# Altium footprint library SparkFun.PCBLIB: 674 footprints (part 42 of 44)
Each footprint in its own frame and in the unit in brackets; x right, y up, seen from the top. Pads: shape width x height; smd on the part's side, far side on the other; paste and mask are expansions set on the pad; w line width, h text height; cw(c..) or ccw(c..) is an arc to the next point about the centre after c.
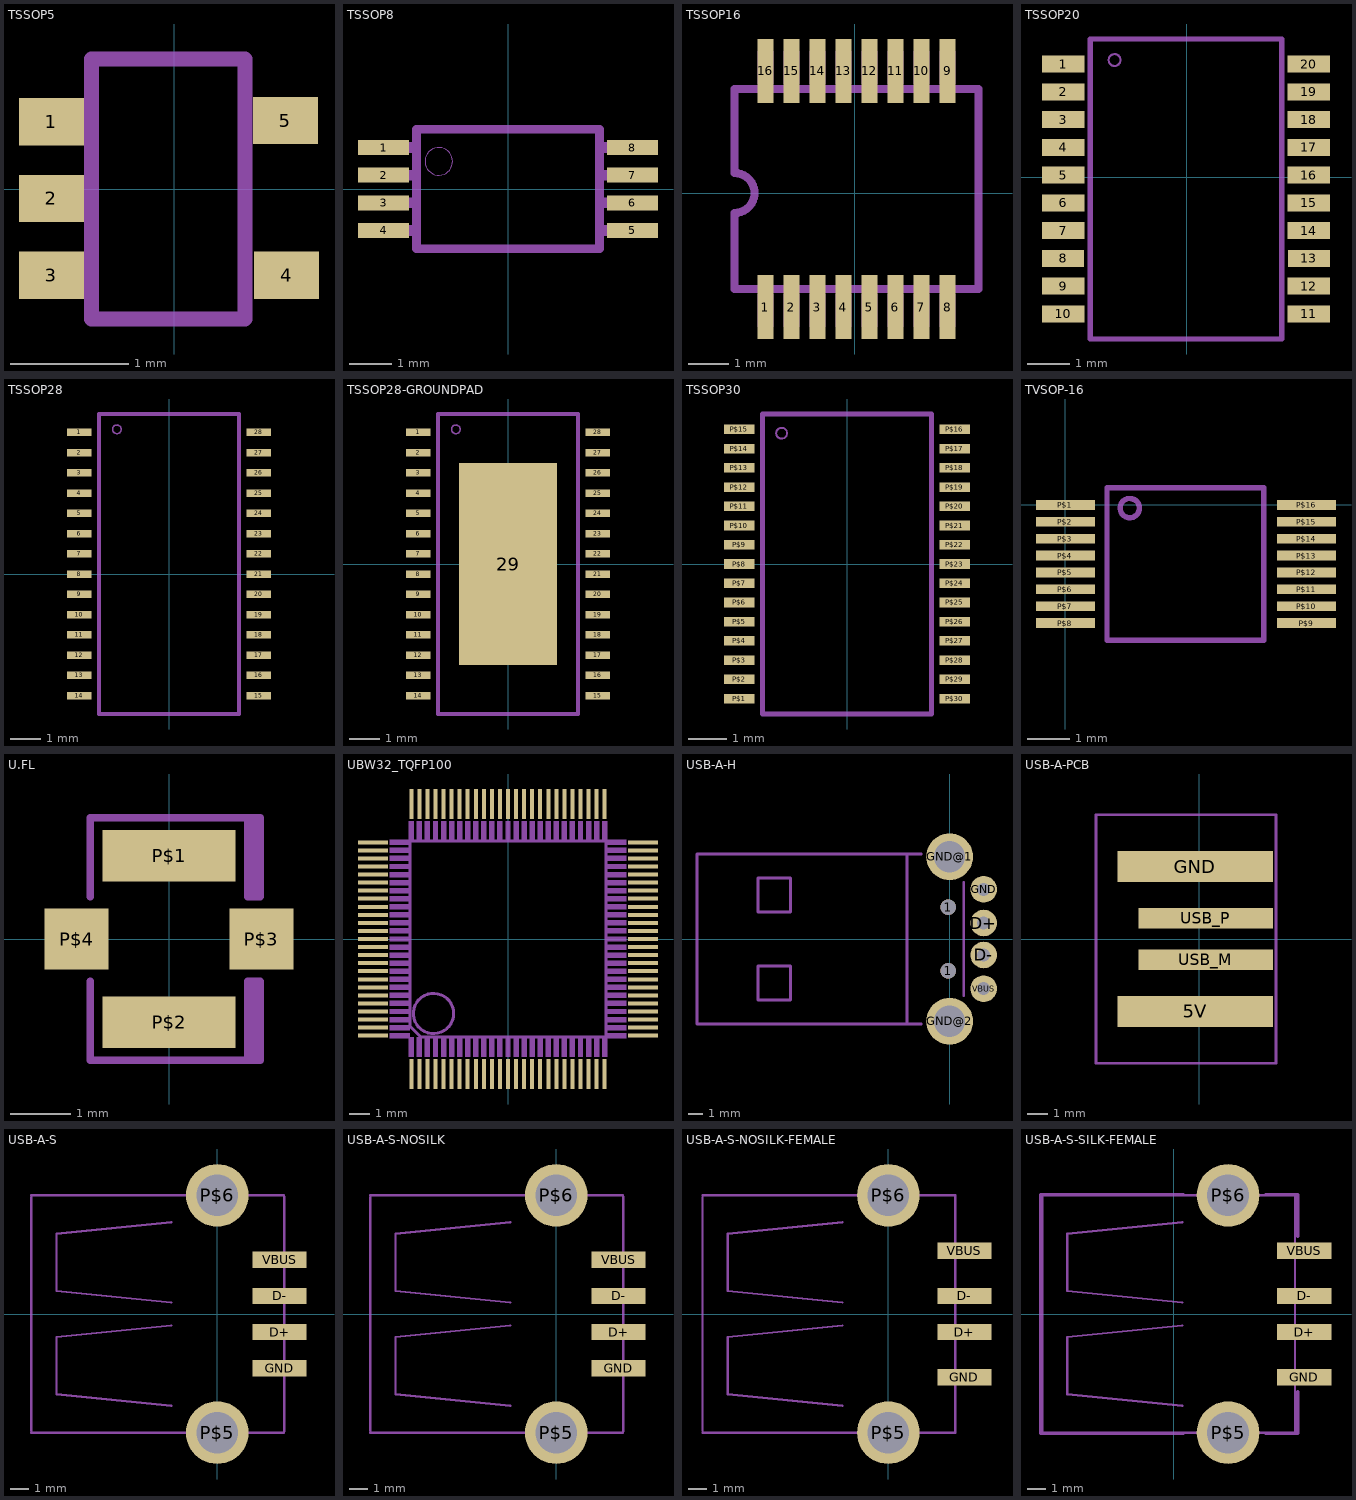
[diagram p41: the footprints below, top view; thin cyan lines are the x and y axes]

## TSSOP5 [mm]
pads (5):
  rect 0.55x0.4 smd: 1(-1.04,0.57) 2(-1.04,-0.08) 3(-1.04,-0.73) 4(0.95,-0.73) 5(0.94,0.58)
Mechanical 2:
  lines w0.127: -0.7,-1 -0.7,-1.1 0.6,-1.1 0.6,-1.02 ; -0.7,0.89 -0.7,1.1 0.59,1.1 0.6,1.1 0.6,0.89
Mechanical 18:
  lines w0.127: -0.7,-1.1 0.6,-1.1 0.6,1.1 -0.7,1.1 -0.7,-1.1

## TSSOP8 [mm]
pads (8):
  rect 1.2x0.35 smd: 1(-2.925,0.975) 2(-2.925,0.325) 3(-2.925,-0.325) 4(-2.925,-0.975) 5(2.925,-0.975) 6(2.925,-0.325) 7(2.925,0.325) 8(2.925,0.975)
Mechanical 2:
  circle w0: c-1.625,0.65 r0.325
  lines w0.203: -2.15,-1.4 2.15,-1.4 2.15,1.4 -2.15,1.4 -2.15,-1.4
Mechanical 18:
  rectangle: -3.2,0.85 -2.2,1.1
  rectangle: -3.2,0.2 -2.2,0.45
  rectangle: -3.2,-0.45 -2.2,-0.2
  rectangle: -3.2,-1.1 -2.2,-0.85
  rectangle: 2.2,-1.1 3.2,-0.85
  rectangle: 2.2,-0.45 3.2,-0.2
  rectangle: 2.2,0.2 3.2,0.45
  rectangle: 2.2,0.85 3.2,1.1

## TSSOP16 [mil]
pads (16):
  rect 15.75x62.99 smd: 1(-87.6,-112.2) 2(-62.01,-112.2) 3(-36.42,-112.2) 4(-10.83,-112.2) 5(14.76,-112.2) 6(40.35,-112.2) 7(65.94,-112.2) 8(91.54,-112.2) 9(91.54,120.08) 10(65.94,120.08) 11(40.35,120.08) 12(14.76,120.08) 13(-10.83,120.08) 14(-36.42,120.08) 15(-62.01,120.08) 16(-87.6,120.08)
Mechanical 2:
  lines w8: -110.24,-94.49 -118.11,-94.49 -118.11,-19.69 ccw(c-118.11,0) -118.11,19.69 -118.11,102.36 -110.24,102.36 ; 114.17,-94.49 122.05,-94.49 122.05,102.36 114.17,102.36
Mechanical 18:
  rectangle: -95.47,-131.89 -79.72,-99.6
  rectangle: -69.88,-131.89 -54.13,-99.6
  rectangle: -44.29,-131.89 -28.54,-99.6
  rectangle: -18.7,-131.89 -2.95,-99.6
  rectangle: 6.89,-131.89 22.64,-99.6
  rectangle: 32.48,-131.89 48.23,-99.6
  rectangle: 58.07,-131.89 73.82,-99.6
  rectangle: 83.66,-131.89 99.41,-99.6
  rectangle: 83.66,107.48 99.41,139.77
  rectangle: 58.07,107.48 73.82,139.77
  rectangle: 32.48,107.48 48.23,139.77
  rectangle: 6.89,107.48 22.64,139.77
  rectangle: -18.7,107.48 -2.95,139.77
  rectangle: -44.29,107.48 -28.54,139.77
  rectangle: -69.88,107.48 -54.13,139.77
  rectangle: -95.47,107.48 -79.72,139.77
  rectangle: -95.47,-131.89 -79.72,-99.6
  rectangle: -69.88,-131.89 -54.13,-99.6
  rectangle: -44.29,-131.89 -28.54,-99.6
  rectangle: -18.7,-131.89 -2.95,-99.6
  rectangle: 6.89,-131.89 22.64,-99.6
  rectangle: 32.48,-131.89 48.23,-99.6
  rectangle: 58.07,-131.89 73.82,-99.6
  rectangle: 83.66,-131.89 99.41,-99.6
  rectangle: 83.66,107.48 99.41,139.77
  rectangle: 58.07,107.48 73.82,139.77
  rectangle: 32.48,107.48 48.23,139.77
  rectangle: 6.89,107.48 22.64,139.77
  rectangle: -18.7,107.48 -2.95,139.77
  rectangle: -44.29,107.48 -28.54,139.77
  rectangle: -69.88,107.48 -54.13,139.77
  rectangle: -95.47,107.48 -79.72,139.77
  lines w8: -118.11,-94.49 122.05,-94.49 122.05,102.36 -118.11,102.36

## TSSOP20 [mm]
pads (20):
  rect 1x0.4 smd: 1(-2.937,2.693) 2(-2.937,2.033) 3(-2.937,1.372) 4(-2.937,0.712) 5(-2.937,0.051) 6(-2.937,-0.609) 7(-2.937,-1.269) 8(-2.943,-1.93) 9(-2.937,-2.59) 10(-2.937,-3.251) 11(2.905,-3.251) 12(2.905,-2.59) 13(2.911,-1.93) 14(2.905,-1.269) 15(2.905,-0.609) 16(2.905,0.051) 17(2.905,0.712) 18(2.905,1.372) 19(2.905,2.033) 20(2.905,2.693)
Mechanical 2:
  circle w0.05: c-1.716,2.791 r0.141
  lines w0.127: -2.292,-3.849 2.26,-3.849 2.26,3.291 -2.292,3.291 -2.292,-3.849
Mechanical 18:
  lines w0.127: -2.292,-3.849 2.26,-3.849 2.26,3.291 -2.292,3.291 -2.292,-3.849

## TSSOP28 [mil]
pads (28):
  rect 31.5x9.84 smd: 1(-115,182) 2(-115,156) 3(-115,130) 4(-115,104) 5(-115,78) 6(-115,52) 7(-115,26) 8(-115.24,0) 9(-115,-26) 10(-115,-52) 11(-115,-78) 12(-115,-104) 13(-115,-130) 14(-115,-156) 15(115,-156) 16(115,-130) 17(115,-104) 18(115,-78) 19(115,-52) 20(115,-26) 21(115.24,0) 22(115,26) 23(115,52) 24(115,78) 25(115,104) 26(115,130) 27(115,156) 28(115,182)
Mechanical 2:
  circle w1.97: c-66.93,185.86 r5.57
  lines w5: -89.61,-179.54 89.61,-179.54 89.61,205.54 -89.61,205.54 -89.61,-179.54
Mechanical 18:
  lines w5: -89.61,-179.54 89.61,-179.54 89.61,205.54 -89.61,205.54 -89.61,-179.54

## TSSOP28-GROUNDPAD [mil]
pads (29):
  rect 31.5x9.84 smd: 1(-115,169.2) 2(-115,143.2) 3(-115,117.2) 4(-115,91.2) 5(-115,65.2) 6(-115,39.2) 7(-115,13.2) 8(-115.24,-12.8) 9(-115,-38.8) 10(-115,-64.8) 11(-115,-90.8) 12(-115,-116.8) 13(-115,-142.8) 14(-115,-168.8) 15(115,-168.8) 16(115,-142.8) 17(115,-116.8) 18(115,-90.8) 19(115,-64.8) 20(115,-38.8) 21(115.24,-12.8) 22(115,13.2) 23(115,39.2) 24(115,65.2) 25(115,91.2) 26(115,117.2) 27(115,143.2) 28(115,169.2)
  rect 125.98x259.84 smd paste-129.92: 29(0,0.2)
Top Paste:
  region: 0,0 10,0 10,10 0,10
Mechanical 2:
  circle w1.97: c-66.93,173.06 r5.57
  lines w5: -89.61,-192.34 89.61,-192.34 89.61,192.75 -89.61,192.75 -89.61,-192.34
Mechanical 18:
  lines w5: -89.61,-192.34 89.61,-192.34 89.61,192.75 -89.61,192.75 -89.61,-192.34

## TSSOP30 [mil]
pads (30):
  rect 31.5x9.84 smd: P$1(-110.24,-137.8) P$2(-110.24,-118.11) P$3(-110.24,-98.43) P$4(-110.24,-78.74) P$5(-110.24,-59.06) P$6(-110.24,-39.37) P$7(-110.24,-19.69) P$8(-110.24,0) P$9(-110.24,19.69) P$10(-110.24,39.37) P$11(-110.24,59.06) P$12(-110.24,78.74) P$13(-110.24,98.43) P$14(-110.24,118.11) P$15(-110.24,137.8) P$16(110.24,137.8) P$17(110.24,118.11) P$18(110.24,98.43) P$19(110.24,78.74) P$20(110.24,59.06) P$21(110.24,39.37) P$22(110.24,19.69) P$23(110.24,0) P$24(110.24,-19.69) P$25(110.24,-39.37) P$26(110.24,-59.06) P$27(110.24,-78.74) P$28(110.24,-98.43) P$29(110.24,-118.11) P$30(110.24,-137.8)
Mechanical 2:
  circle w1.97: c-66.93,133.86 r5.57
  lines w5: -86.61,-153.54 86.61,-153.54 86.61,153.54 -86.61,153.54 -86.61,-153.54
Mechanical 18:
  lines w5: -86.61,-153.54 86.61,-153.54 86.61,153.54 -86.61,153.54 -86.61,-153.54

## TVSOP-16 [mil]
pads (16):
  rect 55x9.06 smd: P$1(0,0) P$2(0,-15.75) P$3(0,-31.5) P$4(0,-47.24) P$5(0,-62.99) P$6(0,-78.74) P$7(0,-94.49) P$8(0,-110.24) P$9(225,-110.24) P$10(225,-94.49) P$11(225,-78.74) P$12(225,-62.99) P$13(225,-47.24) P$14(225,-31.5) P$15(225,-15.75) P$16(225,0)
Mechanical 2:
  circle w5: c60.04,-2.95 r9.03
  lines w5: 38.78,-126.18 38.78,15.94 185.04,15.94 185.04,-126.18 38.78,-126.18

## U.FL [mm]
pads (4):
  rect 2.2x0.85 smd: P$1(0,1.375) P$2(0,-1.375)
  rect 1.05x1 smd: P$3(1.525,0) P$4(-1.525,0)
Mechanical 2:
  lines w0.127: -1.3,-0.7 -1.3,-2 1.3,-2 ; -1.3,0.7 -1.3,2 1.3,2 ; 1.4,-2 1.4,-0.7 ; 1.4,0.7 1.4,2 ; 1.3,-2 1.3,-0.7 1.5,-0.7 1.5,-2 1.3,-2 ; 1.3,2 1.3,0.7 1.5,0.7 1.5,2 1.3,2

## UBW32_TQFP100 [mm]
pads (100):
  rect 0.2x1.5 smd paste-0.75: 1(-4.8,-6.7) 2(-4.4,-6.7) 3(-4,-6.7) 4(-3.6,-6.7) 5(-3.2,-6.7) 6(-2.8,-6.7) 7(-2.4,-6.7) 8(-2,-6.7) 9(-1.6,-6.7) 10(-1.2,-6.7) 11(-0.8,-6.7) 12(-0.4,-6.7) 13(0,-6.7) 14(0.4,-6.7) 15(0.8,-6.7) 16(1.2,-6.7) 17(1.6,-6.7) 18(2,-6.7) 19(2.4,-6.7) 20(2.8,-6.7) 21(3.2,-6.7) 22(3.6,-6.7) 23(4,-6.7) 24(4.4,-6.7) 25(4.8,-6.7) 51(4.8,6.7) 52(4.4,6.7) 53(4,6.7) 54(3.6,6.7) 55(3.2,6.7) 56(2.8,6.7) 57(2.4,6.7) 58(2,6.7) 59(1.6,6.7) 60(1.2,6.7) 61(0.8,6.7) 62(0.4,6.7) 63(0,6.7) 64(-0.4,6.7) 65(-0.8,6.7) 66(-1.2,6.7) 67(-1.6,6.7) 68(-2,6.7) 69(-2.4,6.7) 70(-2.8,6.7) 71(-3.2,6.7) 72(-3.6,6.7) 73(-4,6.7) 74(-4.4,6.7) 75(-4.8,6.7)
  rect 1.5x0.2 smd paste-0.75: 26(6.7,-4.8) 27(6.7,-4.4) 28(6.7,-4) 29(6.7,-3.6) 30(6.7,-3.2) 31(6.7,-2.8) 32(6.7,-2.4) 33(6.7,-2) 34(6.7,-1.6) 35(6.7,-1.2) 36(6.7,-0.8) 37(6.7,-0.4) 38(6.7,0) 39(6.7,0.4) 40(6.7,0.8) 41(6.7,1.2) 42(6.7,1.6) 43(6.7,2) 44(6.7,2.4) 45(6.7,2.8) 46(6.7,3.2) 47(6.7,3.6) 48(6.7,4) 49(6.7,4.4) 50(6.7,4.8) 76(-6.7,4.8) 77(-6.7,4.4) 78(-6.7,4) 79(-6.7,3.6) 80(-6.7,3.2) 81(-6.7,2.8) 82(-6.7,2.4) 83(-6.7,2) 84(-6.7,1.6) 85(-6.7,1.2) 86(-6.7,0.8) 87(-6.7,0.4) 88(-6.7,0) 89(-6.7,-0.4) 90(-6.7,-0.8) 91(-6.7,-1.2) 92(-6.7,-1.6) 93(-6.7,-2) 94(-6.7,-2.4) 95(-6.7,-2.8) 96(-6.7,-3.2) 97(-6.7,-3.6) 98(-6.7,-4) 99(-6.7,-4.4) 100(-6.7,-4.8)
Top Paste:
  rectangle: -7.209,4.707 -6.386,4.892
  rectangle: -6.952,4.313 -6.154,4.491
  rectangle: -7.186,3.907 -6.363,4.092
  rectangle: -6.929,3.513 -6.132,3.691
  rectangle: -7.198,3.109 -6.375,3.294
  rectangle: -6.942,2.715 -6.144,2.893
  rectangle: -7.209,2.309 -6.386,2.494
  rectangle: -6.952,1.915 -6.154,2.093
  rectangle: -7.209,1.509 -6.386,1.694
  rectangle: -6.952,1.115 -6.154,1.293
  rectangle: -7.186,0.709 -6.363,0.894
  rectangle: -6.929,0.315 -6.132,0.493
  rectangle: -7.198,-0.089 -6.375,0.097
  rectangle: -6.942,-0.483 -6.144,-0.305
  rectangle: -7.209,-0.889 -6.386,-0.704
  rectangle: -6.952,-1.283 -6.154,-1.105
  rectangle: -7.209,-1.694 -6.386,-1.509
  rectangle: -6.952,-2.088 -6.154,-1.91
  rectangle: -7.186,-2.494 -6.363,-2.309
  rectangle: -6.929,-2.888 -6.132,-2.71
  rectangle: -7.198,-3.292 -6.375,-3.106
  rectangle: -6.942,-3.686 -6.144,-3.508
  rectangle: -7.209,-4.092 -6.386,-3.907
  rectangle: -6.952,-4.486 -6.154,-4.308
  rectangle: -7.209,-4.895 -6.386,-4.709
  region: -4.707,6.17 -4.707,6.993 -4.892,6.993 -4.892,6.17
  region: -4.313,6.426 -4.313,7.224 -4.491,7.224 -4.491,6.426
  region: -3.907,6.193 -3.907,7.015 -4.092,7.015 -4.092,6.193
  region: -3.513,6.449 -3.513,7.247 -3.691,7.247 -3.691,6.449
  region: -3.109,6.18 -3.109,7.003 -3.294,7.003 -3.294,6.18
  region: -2.715,6.436 -2.715,7.234 -2.893,7.234 -2.893,6.436
  region: -2.309,6.17 -2.309,6.993 -2.494,6.993 -2.494,6.17
  region: -1.915,6.426 -1.915,7.224 -2.093,7.224 -2.093,6.426
  region: -1.509,6.17 -1.509,6.993 -1.694,6.993 -1.694,6.17
  region: -1.115,6.426 -1.115,7.224 -1.293,7.224 -1.293,6.426
  region: -0.709,6.193 -0.709,7.015 -0.894,7.015 -0.894,6.193
  region: -0.315,6.449 -0.315,7.247 -0.493,7.247 -0.493,6.449
  region: 0.089,6.18 0.089,7.003 -0.097,7.003 -0.097,6.18
  region: 0.483,6.436 0.483,7.234 0.305,7.234 0.305,6.436
  region: 0.889,6.17 0.889,6.992 0.703,6.992 0.703,6.17
  region: 1.283,6.426 1.283,7.224 1.105,7.224 1.105,6.426
  region: 1.694,6.17 1.694,6.993 1.509,6.993 1.509,6.17
  region: 2.088,6.426 2.088,7.224 1.91,7.224 1.91,6.426
  region: 2.494,6.193 2.494,7.015 2.309,7.015 2.309,6.193
  region: 2.888,6.449 2.888,7.247 2.71,7.247 2.71,6.449
  region: 3.292,6.18 3.292,7.003 3.106,7.003 3.106,6.18
  region: 3.686,6.436 3.686,7.234 3.508,7.234 3.508,6.436
  region: 4.092,6.17 4.092,6.993 3.907,6.993 3.907,6.17
  region: 4.486,6.426 4.486,7.224 4.308,7.224 4.308,6.426
  region: 4.895,6.17 4.895,6.993 4.709,6.993 4.709,6.17
  region: 7.206,-4.707 6.383,-4.707 6.383,-4.892 7.206,-4.892
  region: 6.949,-4.313 6.152,-4.313 6.152,-4.491 6.949,-4.491
  region: 7.183,-3.907 6.36,-3.907 6.36,-4.092 7.183,-4.092
  region: 6.927,-3.513 6.129,-3.513 6.129,-3.691 6.927,-3.691
  region: 7.196,-3.109 6.373,-3.109 6.373,-3.294 7.196,-3.294
  region: 6.939,-2.715 6.142,-2.715 6.142,-2.893 6.939,-2.893
  region: 7.206,-2.309 6.383,-2.309 6.383,-2.494 7.206,-2.494
  region: 6.949,-1.915 6.152,-1.915 6.152,-2.093 6.949,-2.093
  region: 7.206,-1.509 6.383,-1.509 6.383,-1.694 7.206,-1.694
  region: 6.949,-1.115 6.152,-1.115 6.152,-1.293 6.949,-1.293
  region: 7.183,-0.709 6.36,-0.709 6.36,-0.894 7.183,-0.894
  region: 6.927,-0.315 6.129,-0.315 6.129,-0.493 6.927,-0.493
  region: 7.196,0.089 6.373,0.089 6.373,-0.097 7.196,-0.097
  region: 6.939,0.483 6.142,0.483 6.142,0.305 6.939,0.305
  region: 7.206,0.889 6.383,0.889 6.383,0.704 7.206,0.704
  region: 6.949,1.283 6.152,1.283 6.152,1.105 6.949,1.105
  region: 7.206,1.694 6.383,1.694 6.383,1.509 7.206,1.509
  region: 6.949,2.088 6.152,2.088 6.152,1.91 6.949,1.91
  region: 7.183,2.494 6.36,2.494 6.36,2.309 7.183,2.309
  region: 6.927,2.888 6.129,2.888 6.129,2.71 6.927,2.71
  region: 7.196,3.292 6.373,3.292 6.373,3.106 7.196,3.106
  region: 6.939,3.686 6.142,3.686 6.142,3.508 6.939,3.508
  region: 7.206,4.092 6.383,4.092 6.383,3.907 7.206,3.907
  region: 6.949,4.486 6.152,4.486 6.152,4.308 6.949,4.308
  region: 7.206,4.895 6.383,4.895 6.383,4.709 7.206,4.709
  region: -4.707,-7.219 -4.707,-6.396 -4.892,-6.396 -4.892,-7.219
  region: -4.313,-6.962 -4.313,-6.165 -4.491,-6.165 -4.491,-6.962
  region: -3.907,-7.196 -3.907,-6.373 -4.092,-6.373 -4.092,-7.196
  region: -3.513,-6.939 -3.513,-6.142 -3.691,-6.142 -3.691,-6.939
  region: -3.109,-7.209 -3.109,-6.386 -3.294,-6.386 -3.294,-7.209
  region: -2.715,-6.952 -2.715,-6.154 -2.893,-6.154 -2.893,-6.952
  region: -2.309,-7.219 -2.309,-6.396 -2.494,-6.396 -2.494,-7.219
  region: -1.915,-6.962 -1.915,-6.165 -2.093,-6.165 -2.093,-6.962
  region: -1.509,-7.219 -1.509,-6.396 -1.694,-6.396 -1.694,-7.219
  region: -1.115,-6.962 -1.115,-6.165 -1.293,-6.165 -1.293,-6.962
  region: -0.709,-7.196 -0.709,-6.373 -0.894,-6.373 -0.894,-7.196
  region: -0.315,-6.939 -0.315,-6.142 -0.493,-6.142 -0.493,-6.939
  region: 0.089,-7.208 0.089,-6.386 -0.097,-6.386 -0.097,-7.208
  region: 0.483,-6.952 0.483,-6.154 0.305,-6.154 0.305,-6.952
  region: 0.889,-7.219 0.889,-6.396 0.703,-6.396 0.703,-7.219
  region: 1.283,-6.962 1.283,-6.165 1.105,-6.165 1.105,-6.962
  region: 1.694,-7.219 1.694,-6.396 1.509,-6.396 1.509,-7.219
  region: 2.088,-6.962 2.088,-6.165 1.91,-6.165 1.91,-6.962
  region: 2.494,-7.196 2.494,-6.373 2.309,-6.373 2.309,-7.196
  region: 2.888,-6.939 2.888,-6.142 2.71,-6.142 2.71,-6.939
  region: 3.292,-7.209 3.292,-6.386 3.106,-6.386 3.106,-7.209
  region: 3.686,-6.952 3.686,-6.154 3.508,-6.154 3.508,-6.952
  region: 4.092,-7.219 4.092,-6.396 3.907,-6.396 3.907,-7.219
  region: 4.486,-6.962 4.486,-6.165 4.308,-6.165 4.308,-6.962
  region: 4.895,-7.219 4.895,-6.396 4.709,-6.396 4.709,-7.219
Mechanical 2:
  circle w0.152: c-3.7,-3.7 r1
  lines w0.152: -4.873,-4.323 -4.323,-4.873 4.873,-4.873 4.873,4.873 -4.873,4.873 -4.873,-4.323
Mechanical 18:
  rectangle: -4.935,4.868 -4.665,5.873
  rectangle: -4.535,4.868 -4.265,5.873
  rectangle: -4.135,4.868 -3.865,5.873
  rectangle: -3.735,4.868 -3.465,5.873
  rectangle: -3.335,4.868 -3.065,5.873
  rectangle: -2.935,4.868 -2.665,5.873
  rectangle: -2.535,4.868 -2.265,5.873
  rectangle: -2.135,4.868 -1.865,5.873
  rectangle: -1.735,4.868 -1.465,5.873
  rectangle: -1.335,4.868 -1.065,5.873
  rectangle: -0.935,4.868 -0.665,5.873
  rectangle: -0.535,4.868 -0.265,5.873
  rectangle: -0.135,4.868 0.135,5.873
  rectangle: 0.265,4.868 0.535,5.873
  rectangle: 0.665,4.868 0.935,5.873
  rectangle: 1.065,4.868 1.335,5.873
  rectangle: 1.465,4.868 1.735,5.873
  rectangle: 1.865,4.868 2.135,5.873
  rectangle: 2.265,4.868 2.535,5.873
  rectangle: 2.665,4.868 2.935,5.873
  rectangle: 3.065,4.868 3.335,5.873
  rectangle: 3.465,4.868 3.735,5.873
  rectangle: 3.865,4.868 4.135,5.873
  rectangle: 4.265,4.868 4.535,5.873
  rectangle: 4.665,4.868 4.935,5.873
  rectangle: 4.873,4.665 5.878,4.935
  rectangle: 4.873,4.265 5.878,4.535
  rectangle: 4.873,3.865 5.878,4.135
  rectangle: 4.873,3.465 5.878,3.735
  rectangle: 4.873,3.065 5.878,3.335
  rectangle: 4.873,2.665 5.878,2.935
  rectangle: 4.873,2.265 5.878,2.535
  rectangle: 4.873,1.865 5.878,2.135
  rectangle: 4.873,1.465 5.878,1.735
  rectangle: 4.873,1.065 5.878,1.335
  rectangle: 4.873,0.665 5.878,0.935
  rectangle: 4.873,0.265 5.878,0.535
  rectangle: 4.873,-0.135 5.878,0.135
  rectangle: 4.873,-0.535 5.878,-0.265
  rectangle: 4.873,-0.935 5.878,-0.665
  rectangle: 4.873,-1.335 5.878,-1.065
  rectangle: 4.873,-1.735 5.878,-1.465
  rectangle: 4.873,-2.135 5.878,-1.865
  rectangle: 4.873,-2.535 5.878,-2.265
  rectangle: 4.873,-2.935 5.878,-2.665
  rectangle: 4.873,-3.335 5.878,-3.065
  rectangle: 4.873,-3.735 5.878,-3.465
  rectangle: 4.873,-4.135 5.878,-3.865
  rectangle: 4.873,-4.535 5.878,-4.265
  rectangle: 4.873,-4.935 5.878,-4.665
  rectangle: 4.665,-5.873 4.935,-4.868
  rectangle: 4.265,-5.873 4.535,-4.868
  rectangle: 3.865,-5.873 4.135,-4.868
  rectangle: 3.465,-5.873 3.735,-4.868
  rectangle: 3.065,-5.873 3.335,-4.868
  rectangle: 2.665,-5.873 2.935,-4.868
  rectangle: 2.265,-5.873 2.535,-4.868
  rectangle: 1.865,-5.873 2.135,-4.868
  rectangle: 1.465,-5.873 1.735,-4.868
  rectangle: 1.065,-5.873 1.335,-4.868
  rectangle: 0.665,-5.873 0.935,-4.868
  rectangle: 0.265,-5.873 0.535,-4.868
  rectangle: -0.135,-5.873 0.135,-4.868
  rectangle: -0.535,-5.873 -0.265,-4.868
  rectangle: -0.935,-5.873 -0.665,-4.868
  rectangle: -1.335,-5.873 -1.065,-4.868
  rectangle: -1.735,-5.873 -1.465,-4.868
  rectangle: -2.135,-5.873 -1.865,-4.868
  rectangle: -2.535,-5.873 -2.265,-4.868
  rectangle: -2.935,-5.873 -2.665,-4.868
  rectangle: -3.335,-5.873 -3.065,-4.868
  rectangle: -3.735,-5.873 -3.465,-4.868
  rectangle: -4.135,-5.873 -3.865,-4.868
  rectangle: -4.535,-5.873 -4.265,-4.868
  rectangle: -4.935,-5.873 -4.665,-4.868
  rectangle: -5.878,-4.935 -4.873,-4.665
  rectangle: -5.878,-4.535 -4.873,-4.265
  rectangle: -5.878,-4.135 -4.873,-3.865
  rectangle: -5.878,-3.735 -4.873,-3.465
  rectangle: -5.878,-3.335 -4.873,-3.065
  rectangle: -5.878,-2.935 -4.873,-2.665
  rectangle: -5.878,-2.535 -4.873,-2.265
  rectangle: -5.878,-2.135 -4.873,-1.865
  rectangle: -5.878,-1.735 -4.873,-1.465
  rectangle: -5.878,-1.335 -4.873,-1.065
  rectangle: -5.878,-0.935 -4.873,-0.665
  rectangle: -5.878,-0.535 -4.873,-0.265
  rectangle: -5.878,-0.135 -4.873,0.135
  rectangle: -5.878,0.265 -4.873,0.535
  rectangle: -5.878,0.665 -4.873,0.935
  rectangle: -5.878,1.065 -4.873,1.335
  rectangle: -5.878,1.465 -4.873,1.735
  rectangle: -5.878,1.865 -4.873,2.135
  rectangle: -5.878,2.265 -4.873,2.535
  rectangle: -5.878,2.665 -4.873,2.935
  rectangle: -5.878,3.065 -4.873,3.335
  rectangle: -5.878,3.465 -4.873,3.735
  rectangle: -5.878,3.865 -4.873,4.135
  rectangle: -5.878,4.265 -4.873,4.535
  rectangle: -5.878,4.665 -4.873,4.935

## USB-A-H [mil]
pads (8):
  round 43.31 hole 43.31: 1(-3.94,-88.58) 1(-3.94,88.58)
  round 74 hole 36: D+(94.49,44.37) D-(94.49,-44.37) GND(94.49,137.8) VBUS(94.49,-137.8)
  round 129.91 hole 86.61: GND@1(0,228.35) GND@2(0,-228.35)
Mechanical 2:
  lines w8: -78.74,-236.22 -118.11,-236.22 -118.11,236.22 -78.74,236.22 ; 39.37,-157.48 39.37,157.48
Mechanical 18:
  lines w8: -118.11,-236.22 -700.79,-236.22 -700.79,236.22 -118.11,236.22 ; -531.5,-169.29 -531.5,-74.8 -440.94,-74.8 -440.94,-169.29 -531.5,-169.29 ; -531.5,74.8 -531.5,169.29 -440.94,169.29 -440.94,74.8 -531.5,74.8

## USB-A-PCB [mm]
pads (4):
  rect 7.5x1.5 smd: 5V(-0.2,-3.5) GND(-0.2,3.5)
  rect 6.5x1 smd: USB_M(0.3,-1) USB_P(0.3,1)
Mechanical 18:
  lines w0.127: -5,-6 3.7,-6 3.7,6 -5,6 -5,-6

## USB-A-S [mil]
pads (6):
  rect 118.11x35.43 smd: D+(135.83,-39.37) D-(135.83,39.37) GND(135.83,-118.11) VBUS(135.83,118.11)
  round 136.5 hole 91: P$5(0,-258.5) P$6(0,258.5)
Mechanical 2:
  lines w5: -405,-258.5 145.5,-258.5 ; -405,-255 -405,255 ; -405,258.5 145.5,258.5 ; -100,-200 -350,-175 -350,-50 -100,-25 ; -100,25 -350,50 -350,175 -100,200 ; 146,-256 146,256

## USB-A-S-NOSILK [mil]
pads (6):
  rect 118.11x35.43 smd: D+(135.83,-39.37) D-(135.83,39.37) GND(135.83,-118.11) VBUS(135.83,118.11)
  round 136.5 hole 91: P$5(0,-258.5) P$6(0,258.5)
Mechanical 18:
  lines w5: -405,-258.5 145.5,-258.5 ; -405,-255 -405,255 ; -405,258.5 145.5,258.5 ; -100,-200 -350,-175 -350,-50 -100,-25 ; -100,25 -350,50 -350,175 -100,200 ; 146,-256 146,256

## USB-A-S-NOSILK-FEMALE [mil]
pads (6):
  rect 118.11x35.43 smd: D+(165.83,-39.37) D-(165.83,39.37) GND(165.83,-137.8) VBUS(165.83,137.8)
  round 136.5 hole 91: P$5(0,-258.5) P$6(0,258.5)
Mechanical 18:
  lines w5: -405,-258.5 145.5,-258.5 ; -405,-255 -405,255 ; -405,258.5 145.5,258.5 ; -100,-200 -350,-175 -350,-50 -100,-25 ; -100,25 -350,50 -350,175 -100,200 ; 146,-256 146,256

## USB-A-S-SILK-FEMALE [mil]
pads (6):
  rect 118.11x35.43 smd: D+(283.94,-39.37) D-(283.94,39.37) GND(283.94,-137.8) VBUS(283.94,137.8)
  round 136.5 hole 91: P$5(118.11,-258.5) P$6(118.11,258.5)
Mechanical 2:
  lines w8: 20,-260 -290,-260 -290,260 20,260 ; 200,-260 270,-260 270,-170 ; 200,260 270,260 270,170
Mechanical 18:
  lines w5: -286.89,-258.5 263.61,-258.5 ; -286.89,-255 -286.89,255 ; -286.89,258.5 263.61,258.5 ; 18.11,-200 -231.89,-175 -231.89,-50 18.11,-25 ; 18.11,25 -231.89,50 -231.89,175 18.11,200 ; 264.11,-256 264.11,256